# Altium footprint library IC_updated.PcbLib: 64 footprints (part 2 of 4)
Each footprint in its own frame and in the unit in brackets; x right, y up, seen from the top. Pads: shape width x height; smd on the part's side, far side on the other; paste and mask are expansions set on the pad; w line width, h text height; cw(c..) or ccw(c..) is an arc to the next point about the centre after c.
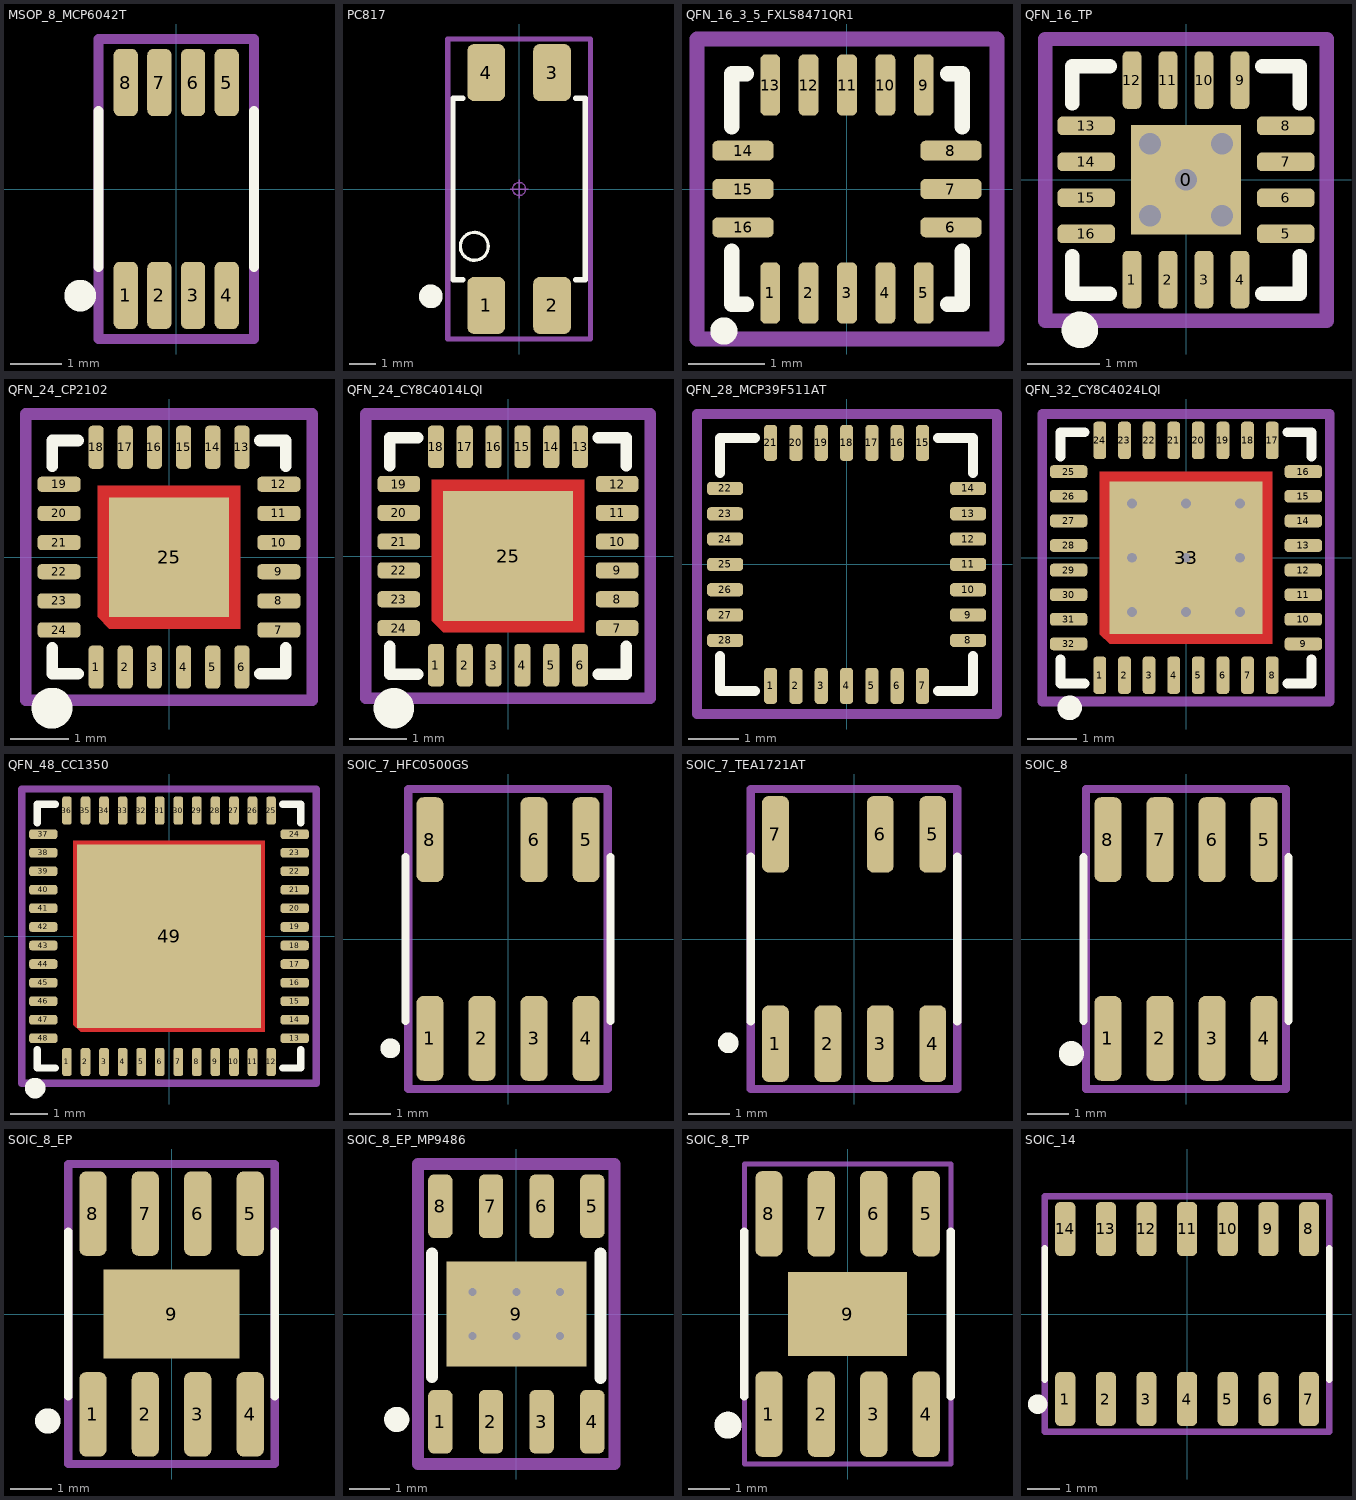
[diagram p1: the footprints below, top view; thin cyan lines are the x and y axes]

## MSOP_8_MCP6042T [mm] "Small Outline Pkg (SOP), 0.65 mm pitch; 8 pin, 3.00 mm L X 3.00 mm W X 1.10 mm H body"
height 1.1
pads (8):
  rrect51% 0.47x1.3 smd: 1(-0.975,-2.055) 2(-0.325,-2.055) 3(0.325,-2.055) 4(0.975,-2.055) 5(0.975,2.055) 6(0.325,2.055) 7(-0.325,2.055) 8(-0.975,2.055)
Top Overlay:
  circle w0.508: c-1.854,-2.057 r0.05
  lines w0.2: -1.5,-1.5 -1.5,1.5 ; 1.5,-1.5 1.5,1.5
Mechanical 13:
  lines w0.2: -1.5,-2.896 1.5,-2.896 1.5,2.896 -1.5,2.896 -1.5,-2.896
  text ".Designator" at -1.295,-0.406 h1.5
3D body "SOP8P65_300X490X110L60X31.STEP": height 1.1, standoff 0, extent -1.5,-2.45 1.5,2.45

## PC817 [mm] "Small Outline IC (SOIC), 2.54 mm pitch; 4 pin, 4.60 mm L X 6.00 mm W X 3.85 mm H body"
height 3.85
pads (4):
  rrect34% 1.45x2.19 smd: 1(-1.27,-4.49) 2(1.27,-4.49) 3(1.27,4.49) 4(-1.27,4.49)
Top Overlay:
  circle w0.508: c-3.404,-4.14 r0.203
  circle w0.127: c-1.727,-2.21 r0.539
  lines w0.2: -2.175,-3.5 -2.55,-3.5 -2.55,3.5 -2.175,3.5 ; 2.175,-3.5 2.55,-3.5 2.55,3.5 2.175,3.5
Mechanical 13:
  lines w0.2: -2.75,-5.785 2.75,-5.785 2.75,-3.7 2.75,3.7 2.75,5.785 -2.75,5.785 -2.75,3.7 -2.75,-3.7 -2.75,-5.785
  text ".Designator" at 0.279,-3.099 h1.5
Mechanical 15:
  circle w0.05: c0,0 r0.25
  lines w0.05: -0.35,0 0.35,0 ; 0,-0.35 0,0.35
3D body "User Library-PC817_Gullwing.STEP": height 3.75, standoff -0.1, extent -2.29,-5.025 2.29,4.975

## QFN_16_3_5_FXLS8471QR1 [mm] "Pullback Quad Flat No-Lead (PQFN), 0.50 mm pitch; square, 5 pin X 3 pin, 3.00 mm L X 3.00 mm W X 0.60 mm H body"
height 0.6
pads (16):
  rrect54% 0.26x0.8 smd: 1(-1,-1.355) 2(-0.5,-1.355) 3(0,-1.355) 4(0.5,-1.355) 5(1,-1.355) 9(1,1.355) 10(0.5,1.355) 11(0,1.355) 12(-0.5,1.355) 13(-1,1.355)
  rrect54% 0.8x0.26 smd: 6(1.355,-0.5) 7(1.355,0) 8(1.355,0.5) 14(-1.355,0.5) 15(-1.355,0) 16(-1.355,-0.5)
Top Overlay:
  circle w0.254: c-1.605,-1.851 r0.05
  lines w0.2: -1.5,-0.81 -1.5,-1.5 -1.31,-1.5 ; -1.5,0.81 -1.5,1.5 -1.31,1.5 ; 1.31,-1.5 1.5,-1.5 1.5,-0.81 ; 1.31,1.5 1.5,1.5 1.5,0.81
Mechanical 13:
  lines w0.2: -1.955,-1.955 -1.955,-0.83 -1.955,0.83 -1.955,1.955 -1.33,1.955 1.33,1.955 1.955,1.955 1.955,0.83 1.955,-0.83 1.955,-1.955 1.33,-1.955 -1.33,-1.955 -1.955,-1.955
  text ".Designator" at -0.737,-0.152 h1
3D body "QFN17P50_300X300X100L46X24T0.STEP": height 1, standoff 0, extent -1.55,-1.55 1.55,1.55

## QFN_16_TP [mm] "Quad Flat No-Lead (QFN), 0.50 mm pitch; square, 4 pin X 4 pin, 3.00 mm L X 3.00 mm W X 0.80 mm H body"
height 0.8
pads (17):
  rect 1.524x1.524 smd: 0(0,0)
  rrect54% 0.26x0.8 smd: 1(-0.75,-1.385) 2(-0.25,-1.385) 3(0.25,-1.385) 4(0.75,-1.385) 9(0.75,1.385) 10(0.25,1.385) 11(-0.25,1.385) 12(-0.75,1.385)
  rrect54% 0.8x0.26 smd: 5(1.385,-0.75) 6(1.385,-0.25) 7(1.385,0.25) 8(1.385,0.75) 13(-1.385,0.75) 14(-1.385,0.25) 15(-1.385,-0.25) 16(-1.385,-0.75)
via -0.5,0.5 diameter 0.5 hole 0.3
via -0.5,-0.5 diameter 0.5 hole 0.3
via 0.5,-0.5 diameter 0.5 hole 0.3
via 0.5,0.5 diameter 0.5 hole 0.3
via 0,0 diameter 0.5 hole 0.3
Top Overlay:
  circle w0.254: c-1.473,-2.083 r0.127
  lines w0.2: -1.58,-1.06 -1.58,-1.58 -1.06,-1.58 ; -1.58,1.06 -1.58,1.58 -1.06,1.58 ; 1.06,-1.58 1.58,-1.58 1.58,-1.06 ; 1.06,1.58 1.58,1.58 1.58,1.06
Mechanical 13:
  lines w0.2: -1.956,-1.956 -1.956,1.956 1.956,1.956 1.956,-1.956 -1.956,-1.956
  text ".Designator" at -1.727,-0.254 h1.5
3D body "QFN16P50_300X300X80L40X24.STEP": height 0.8, standoff 0, extent -1.55,-1.55 1.55,1.55

## QFN_24_CP2102 [mm] "Quad Flat No-Lead (QFN with Tab), 0.50 mm pitch; square, 6 pin X 6 pin, 4.00 mm L X 4.00 mm W X 0.80 mm H body"
height 0.8
pads (25):
  rrect54% 0.26x0.74 smd: 1(-1.25,-1.885) 2(-0.75,-1.885) 3(-0.25,-1.885) 4(0.25,-1.885) 5(0.75,-1.885) 6(1.25,-1.885) 13(1.25,1.885) 14(0.75,1.885) 15(0.25,1.885) 16(-0.25,1.885) 17(-0.75,1.885) 18(-1.25,1.885)
  rrect54% 0.74x0.26 smd: 7(1.885,-1.25) 8(1.885,-0.75) 9(1.885,-0.25) 10(1.885,0.25) 11(1.885,0.75) 12(1.885,1.25) 19(-1.885,1.25) 20(-1.885,0.75) 21(-1.885,0.25) 22(-1.885,-0.25) 23(-1.885,-0.75) 24(-1.885,-1.25)
  rect 2.05x2.05 smd paste-2.05 mask-2.05: 25(0,0)
Top Layer:
  region: 1.225,-1.225 -1.025,-1.225 -1.225,-1.025 -1.225,1.225 1.225,1.225
Top Overlay:
  circle w0.5: c-2.007,-2.591 r0.1
  lines w0.2: -2,-1.56 -2,-2 -1.56,-2 ; -2,1.56 -2,2 -1.56,2 ; 1.56,-2 2,-2 2,-1.56 ; 1.56,2 2,2 2,1.56
Top Paste:
  region: -0.18,0.18 -1.05,0.18 -1.05,1.05 -0.18,1.05
  region: -0.18,-1.05 -1.05,-1.05 -1.05,-0.18 -0.18,-0.18
  region: 1.05,0.18 0.18,0.18 0.18,1.05 1.05,1.05
  region: 1.05,-1.05 0.18,-1.05 0.18,-0.18 1.05,-0.18
Top Solder:
  region: 1.225,-1.225 -1.025,-1.225 -1.225,-1.025 -1.225,1.225 1.225,1.225
Mechanical 13:
  lines w0.2: -2.455,-2.455 -1.58,-2.455 1.58,-2.455 2.455,-2.455 2.455,-1.58 2.455,1.58 2.455,2.455 1.58,2.455 -1.58,2.455 -2.455,2.455 -2.455,1.58 -2.455,-1.58 -2.455,-2.455
  text ".Designator" at -1.905,-0.127 h1
3D body "QFN25P50_400X400X80L40X24T245.STEP": height 0.8, standoff 0, extent -2.05,-2.05 2.05,2.05

## QFN_24_CY8C4014LQI [mm] "Quad Flat No-Lead (QFN with Tab), 0.50 mm pitch; square, 6 pin X 6 pin, 4.00 mm L X 4.00 mm W X 0.55 mm H body"
height 0.55
pads (25):
  rrect50% 0.28x0.74 smd: 1(-1.25,-1.895) 2(-0.75,-1.895) 3(-0.25,-1.895) 4(0.25,-1.895) 5(0.75,-1.895) 6(1.25,-1.895) 13(1.25,1.895) 14(0.75,1.895) 15(0.25,1.895) 16(-0.25,1.895) 17(-0.75,1.895) 18(-1.25,1.895)
  rrect50% 0.74x0.28 smd: 7(1.895,-1.25) 8(1.895,-0.75) 9(1.895,-0.25) 10(1.895,0.25) 11(1.895,0.75) 12(1.895,1.25) 19(-1.895,1.25) 20(-1.895,0.75) 21(-1.895,0.25) 22(-1.895,-0.25) 23(-1.895,-0.75) 24(-1.895,-1.25)
  rect 2.25x2.25 smd paste-2.25 mask-2.25: 25(0,0)
Top Layer:
  region: 1.325,-1.325 -1.125,-1.325 -1.325,-1.125 -1.325,1.325 1.325,1.325
Top Overlay:
  circle w0.5: c-1.981,-2.642 r0.1
  lines w0.2: -2.05,-1.57 -2.05,-2.05 -1.57,-2.05 ; -2.05,1.57 -2.05,2.05 -1.57,2.05 ; 1.57,-2.05 2.05,-2.05 2.05,-1.57 ; 1.57,2.05 2.05,2.05 2.05,1.57
Top Paste:
  region: 1.135,-1.135 0.195,-1.135 0.195,-0.195 1.135,-0.195
  region: 1.135,0.195 0.195,0.195 0.195,1.135 1.135,1.135
  region: -0.195,-1.135 -1.135,-1.135 -1.135,-0.195 -0.195,-0.195
  region: -0.195,0.195 -1.135,0.195 -1.135,1.135 -0.195,1.135
Top Solder:
  region: 1.325,-1.325 -1.125,-1.325 -1.325,-1.125 -1.325,1.325 1.325,1.325
Mechanical 13:
  lines w0.2: -2.465,-2.465 -2.465,-1.59 -2.465,1.59 -2.465,2.465 -1.59,2.465 1.59,2.465 2.465,2.465 2.465,1.59 2.465,-1.59 2.465,-2.465 1.59,-2.465 -1.59,-2.465 -2.465,-2.465
  text ".Designator" at -1.93,-0.152 h1
3D body "QFN25P50_400X400X55L40X25T265.STEP": height 0.55, standoff 0, extent -2.05,-2.05 2.05,2.05

## QFN_28_MCP39F511AT [mm] "Quad Flat No-Lead (QFN), 0.50 mm pitch; square, 7 pin X 7 pin, 5.00 mm L X 5.00 mm W X 1.00 mm H body"
height 1
pads (28):
  rrect54% 0.26x0.71 smd: 1(-1.5,-2.4) 2(-1,-2.4) 3(-0.5,-2.4) 4(0,-2.4) 5(0.5,-2.4) 6(1,-2.4) 7(1.5,-2.4) 15(1.5,2.4) 16(1,2.4) 17(0.5,2.4) 18(0,2.4) 19(-0.5,2.4) 20(-1,2.4) 21(-1.5,2.4)
  rrect54% 0.71x0.26 smd: 8(2.4,-1.5) 9(2.4,-1) 10(2.4,-0.5) 11(2.4,0) 12(2.4,0.5) 13(2.4,1) 14(2.4,1.5) 22(-2.4,1.5) 23(-2.4,1) 24(-2.4,0.5) 25(-2.4,0) 26(-2.4,-0.5) 27(-2.4,-1) 28(-2.4,-1.5)
Top Overlay:
  lines w0.2: -2.5,-1.81 -2.5,-2.5 -1.81,-2.5 ; -2.5,1.81 -2.5,2.5 -1.81,2.5 ; 1.81,-2.5 2.5,-2.5 2.5,-1.81 ; 1.81,2.5 2.5,2.5 2.5,1.81
Mechanical 13:
  lines w0.2: -2.955,-2.955 -2.955,2.972 2.972,2.972 2.972,-2.955 -2.955,-2.955
  text ".Designator" at -1.854,-0.381 h1.5
3D body "QFN28P50_500X500X100L40X24.STEP": height 1, standoff 0, extent -2.55,-2.55 2.55,2.55

## QFN_32_CY8C4024LQI [mm]
pads (33):
  rrect54% 0.26x0.76 smd: 1(-1.75,-2.385) 2(-1.25,-2.385) 3(-0.75,-2.385) 4(-0.25,-2.385) 5(0.25,-2.385) 6(0.75,-2.385) 7(1.25,-2.385) 8(1.75,-2.385) 17(1.75,2.385) 18(1.25,2.385) 19(0.75,2.385) 20(0.25,2.385) 21(-0.25,2.385) 22(-0.75,2.385) 23(-1.25,2.385) 24(-1.75,2.385)
  rrect54% 0.76x0.26 smd: 9(2.385,-1.75) 10(2.385,-1.25) 11(2.385,-0.75) 12(2.385,-0.25) 13(2.385,0.25) 14(2.385,0.75) 15(2.385,1.25) 16(2.385,1.75) 25(-2.385,1.75) 26(-2.385,1.25) 27(-2.385,0.75) 28(-2.385,0.25) 29(-2.385,-0.25) 30(-2.385,-0.75) 31(-2.385,-1.25) 32(-2.385,-1.75)
  rect 3.1x3.1 smd paste-3.1 mask-3.1: 33(0,0)
via 1.1,-1.1 diameter 0.5 hole 0.2
via 0,-1.1 diameter 0.5 hole 0.2
via -1.1,-1.1 diameter 0.5 hole 0.2
via 1.1,0 diameter 0.5 hole 0.2
via 0,0 diameter 0.5 hole 0.2
via -1.1,0 diameter 0.5 hole 0.2
via 1.1,1.1 diameter 0.5 hole 0.2
via 0,1.1 diameter 0.5 hole 0.2
via -1.1,1.1 diameter 0.5 hole 0.2
Top Layer:
  region: 1.75,-1.75 -1.55,-1.75 -1.75,-1.55 -1.75,1.75 1.75,1.75
Top Overlay:
  circle w0.25: c-2.362,-3.048 r0.125
  lines w0.2: -2.55,-2.06 -2.55,-2.55 -2.06,-2.55 ; -2.55,2.06 -2.55,2.55 -2.06,2.55 ; 2.06,-2.55 2.55,-2.55 2.55,-2.06 ; 2.06,2.55 2.55,2.55 2.55,2.06
Top Paste:
  region: -0.255,0.255 -1.495,0.255 -1.495,1.495 -0.255,1.495
  region: -0.255,-1.495 -1.495,-1.495 -1.495,-0.255 -0.255,-0.255
  region: 1.495,0.255 0.255,0.255 0.255,1.495 1.495,1.495
  region: 1.495,-1.495 0.255,-1.495 0.255,-0.255 1.495,-0.255
Top Solder:
  region: 1.75,-1.75 -1.55,-1.75 -1.75,-1.55 -1.75,1.75 1.75,1.75
Mechanical 13:
  lines w0.2: -2.921,-2.921 2.921,-2.921 2.921,2.921 -2.921,2.921 -2.921,-2.921
  text ".Designator" at -1.956,-0.076 h1.5
3D body "QFN33P50_500X500X60L40X24T350.STEP": height 0.6, standoff 0, extent -2.55,-2.55 2.55,2.55

## QFN_48_CC1350 [mm] "Quad Flat No-Lead (QFN with Tab), 0.50 mm pitch; square, 12 pin X 12 pin, 7.00 mm L X 7.00 mm W X 1.00 mm H body"
height 1
pads (49):
  rrect54% 0.26x0.76 smd: 1(-2.75,-3.385) 2(-2.25,-3.385) 3(-1.75,-3.385) 4(-1.25,-3.385) 5(-0.75,-3.385) 6(-0.25,-3.385) 7(0.25,-3.385) 8(0.75,-3.385) 9(1.25,-3.385) 10(1.75,-3.385) 11(2.25,-3.385) 12(2.75,-3.385) 25(2.75,3.385) 26(2.25,3.385) 27(1.75,3.385) 28(1.25,3.385) 29(0.75,3.385) 30(0.25,3.385) 31(-0.25,3.385) 32(-0.75,3.385) 33(-1.25,3.385) 34(-1.75,3.385) 35(-2.25,3.385) 36(-2.75,3.385)
  rrect54% 0.76x0.26 smd: 13(3.385,-2.75) 14(3.385,-2.25) 15(3.385,-1.75) 16(3.385,-1.25) 17(3.385,-0.75) 18(3.385,-0.25) 19(3.385,0.25) 20(3.385,0.75) 21(3.385,1.25) 22(3.385,1.75) 23(3.385,2.25) 24(3.385,2.75) 37(-3.385,2.75) 38(-3.385,2.25) 39(-3.385,1.75) 40(-3.385,1.25) 41(-3.385,0.75) 42(-3.385,0.25) 43(-3.385,-0.25) 44(-3.385,-0.75) 45(-3.385,-1.25) 46(-3.385,-1.75) 47(-3.385,-2.25) 48(-3.385,-2.75)
  rect 4.95x4.95 smd paste-4.95 mask-4.95: 49(0,0)
Top Layer:
  region: 2.575,-2.575 -2.378,-2.575 -2.575,-2.378 -2.575,2.575 2.575,2.575
Top Overlay:
  circle w0.5: c-3.607,-4.089 r0.025
  lines w0.2: -3.55,-3.06 -3.55,-3.55 -3.06,-3.55 ; -3.55,3.06 -3.55,3.55 -3.06,3.55 ; 3.06,-3.55 3.55,-3.55 3.55,-3.06 ; 3.06,3.55 3.55,3.55 3.55,3.06
Top Paste:
  region: 2.195,-2.195 0.375,-2.195 0.375,-0.375 2.195,-0.375
  region: 2.195,0.375 0.375,0.375 0.375,2.195 2.195,2.195
  region: -0.375,-2.195 -2.195,-2.195 -2.195,-0.375 -0.375,-0.375
  region: -0.375,0.375 -2.195,0.375 -2.195,2.195 -0.375,2.195
Top Solder:
  region: 2.575,-2.575 -2.378,-2.575 -2.575,-2.378 -2.575,2.575 2.575,2.575
Mechanical 13:
  lines w0.2: -3.965,-3.965 -3.965,-3.08 -3.965,3.08 -3.965,3.965 -3.08,3.965 3.08,3.965 3.965,3.965 3.965,3.08 3.965,-3.08 3.965,-3.965 3.08,-3.965 -3.08,-3.965 -3.965,-3.965
  text ".Designator" at -2.946,-0.152 h1.5
3D body "QFN49P50_700X700X100L40X24T515.STEP": height 1, standoff 0, extent -3.55,-3.55 3.55,3.55

## SOIC_7_HFC0500GS [mm] "Small Outline IC (SOIC), 1.27 mm pitch; 8 pin, 4.90 mm L X 3.90 mm W X 1.75 mm H body"
height 1.75
pads (7):
  rrect52% 0.66x2.07 smd: 1(-1.905,-2.425) 2(-0.635,-2.425) 3(0.635,-2.425) 4(1.905,-2.425) 5(1.905,2.425) 6(0.635,2.425) 8(-1.905,2.425)
Top Overlay:
  circle w0.381: c-2.87,-2.667 r0.05
  lines w0.2: -2.5,-2 -2.5,2 ; 2.5,-2 2.5,2
Mechanical 13:
  lines w0.2: -2.435,-3.66 -2.435,-2.2 -2.435,2.2 -2.435,3.66 2.435,3.66 2.435,2.2 2.435,-2.2 2.435,-3.66 -2.435,-3.66
  text ".Designator" at -2.184,-0.254 h1.5
3D body "SOIC8P127_490X600X175L84X42.STEP": height 1.75, standoff 0, extent -2.45,-3 2.45,3

## SOIC_7_TEA1721AT [mm] "Small Outline IC (SOIC), 1.27 mm pitch; 8 pin, 4.90 mm L X 3.90 mm W X 1.75 mm H body"
height 1.75
pads (7):
  rrect49% 0.65x1.85 smd: 1(-1.905,-2.535) 2(-0.635,-2.535) 3(0.635,-2.535) 4(1.905,-2.535) 5(1.905,2.535) 6(0.635,2.535) 7(-1.905,2.535)
Top Overlay:
  circle w0.25: c-3.048,-2.515 r0.125
  lines w0.2: -2.5,-2 -2.5,2 ; 2.5,-2 2.5,2
Mechanical 13:
  lines w0.2: -2.5,-3.632 -2.5,3.632 2.5,3.632 2.5,-3.632 -2.5,-3.632
  text ".Designator" at -2.261,-0.406 h1.5
3D body "SOIC8P127_490X600X175L70X42.STEP": height 1.75, standoff 0, extent -2.45,-3 2.45,3

## SOIC_8 [mm] "Small Outline IC (SOIC), 1.27 mm pitch; 8 pin, 4.905 mm L X 3.895 mm W X 1.75 mm H body"
height 1.75
pads (8):
  rrect52% 0.66x2.07 smd: 1(-1.905,-2.42) 2(-0.635,-2.42) 3(0.635,-2.42) 4(1.905,-2.42) 5(1.905,2.42) 6(0.635,2.42) 7(-0.635,2.42) 8(-1.905,2.42)
Top Overlay:
  circle w0.508: c-2.794,-2.794 r0.05
  lines w0.2: -2.5,-1.99 -2.5,1.99 ; 2.5,-1.99 2.5,1.99
Mechanical 13:
  lines w0.2: -2.435,-3.655 -2.435,-2.19 -2.435,2.19 -2.435,3.655 2.435,3.655 2.435,2.19 2.435,-2.19 2.435,-3.655 -2.435,-3.655
  text ".Designator" at -2.184,-0.305 h1.5
3D body "SOIC8P127_490X599X175L84X41.STEP": height 1.75, standoff 0, extent -2.452,-2.997 2.452,2.997

## SOIC_8_EP [mm] "Small Outline IC (SOIC with Tab), 1.27 mm pitch; 8 pin, 4.90 mm L X 3.90 mm W X 1.70 mm H body"
height 1.7
pads (9):
  rrect52% 0.66x2.05 smd: 1(-1.905,-2.43) 2(-0.635,-2.43) 3(0.635,-2.43) 4(1.905,-2.43) 5(1.905,2.43) 6(0.635,2.43) 7(-0.635,2.43) 8(-1.905,2.43)
  rect 3.3x2.159 smd paste-3.3: 9(0,0)
Top Overlay:
  circle w0.5: c-2.997,-2.591 r0.057
  lines w0.2: -2.5,-2 -2.5,2 ; 2.5,-2 2.5,2
Top Paste:
  region: -0.175,0.175 -1.475,0.175 -1.475,1.025 -0.175,1.025
  region: -0.175,-1.025 -1.475,-1.025 -1.475,-0.175 -0.175,-0.175
  region: 1.475,0.175 0.175,0.175 0.175,1.025 1.475,1.025
  region: 1.475,-1.025 0.175,-1.025 0.175,-0.175 1.475,-0.175
Mechanical 13:
  lines w0.2: -2.5,-3.632 2.5,-3.632 2.5,3.632 -2.5,3.632 -2.5,-3.632
  text ".Designator" at -2.134,-0.508 h1.5
3D body "SOIC9P127_490X600X170L84X42T330X241.STEP": height 1.7, standoff 0, extent -2.45,-3 2.45,3

## SOIC_8_EP_MP9486 [mm]
pads (9):
  rrect50% 0.61x1.6 smd: 1(-1.905,-2.7) 2(-0.635,-2.7) 3(0.635,-2.7) 4(1.905,-2.7) 5(1.905,2.7) 6(0.635,2.7) 7(-0.635,2.7) 8(-1.905,2.7)
  rect 3.51x2.62 smd: 9(0,0)
via 1.1,0.55 diameter 0.5 hole 0.2
via 1.1,-0.55 diameter 0.5 hole 0.2
via 0,0.55 diameter 0.5 hole 0.2
via 0,-0.55 diameter 0.5 hole 0.2
via -1.1,0.55 diameter 0.5 hole 0.2
via -1.1,-0.55 diameter 0.5 hole 0.2
Top Overlay:
  circle w0.381: c-2.997,-2.642 r0.125
  lines w0.3: -2.108,-1.575 -2.108,1.515 ; 2.108,-1.6 2.108,1.52
Mechanical 13:
  lines w0.3: -2.464,-3.759 -2.464,3.759 2.464,3.759 2.464,-3.759 -2.464,-3.759
  text ".Designator" at -2.311,-0.432 h1.5
3D body "SOIC8P127_490X599X175L84X41.STEP": height 1.75, standoff 0, extent -2.478,-2.997 2.427,2.997

## SOIC_8_TP [mm] "Small Outline IC (SOIC with Tab), 1.27 mm pitch; 8 pin, 4.90 mm L X 3.90 mm W X 1.70 mm H body"
height 1.7
pads (9):
  rrect52% 0.66x2.07 smd: 1(-1.905,-2.425) 2(-0.635,-2.425) 3(0.635,-2.425) 4(1.905,-2.425) 5(1.905,2.425) 6(0.635,2.425) 7(-0.635,2.425) 8(-1.905,2.425)
  rect 2.875x2.025 smd paste-2.875: 9(0,0)
Top Overlay:
  lines w0.2: -2.5,-2 -2.5,2 ; 2.5,-2 2.5,2
  lines w0.508: -2.825,-2.678 ccw(c-2.896,-2.692) -2.824,-2.692
Top Paste:
  region: -0.15,0.15 -1.29,0.15 -1.29,0.87 -0.15,0.87
  region: -0.15,-0.87 -1.29,-0.87 -1.29,-0.15 -0.15,-0.15
  region: 1.29,0.15 0.15,0.15 0.15,0.87 1.29,0.87
  region: 1.29,-0.87 0.15,-0.87 0.15,-0.15 1.29,-0.15
Mechanical 13:
  lines w0.12: -2.5,-3.632 2.5,-3.632 2.5,3.632 -2.5,3.632 -2.5,-3.632
  text ".Designator" at -2.159,-0.457 h1.5
3D body "SOIC9P127_490X600X170L83X41T287X202.STEP": height 1.7, standoff 0, extent -2.45,-3 2.45,3

## SOIC_14 [mm] "Small Outline IC (SOIC), 1.27 mm pitch; 14 pin, 8.90 mm L X 3.90 mm W X 1.75 mm H body"
height 1.75
pads (14):
  rrect51% 0.63x1.69 smd: 1(-3.81,-2.66) 2(-2.54,-2.66) 3(-1.27,-2.66) 4(0,-2.66) 5(1.27,-2.66) 6(2.54,-2.66) 7(3.81,-2.66) 8(3.81,2.66) 9(2.54,2.66) 10(1.27,2.66) 11(0,2.66) 12(-1.27,2.66) 13(-2.54,2.66) 14(-3.81,2.66)
Top Overlay:
  circle w0.508: c-4.674,-2.819 r0.05
  lines w0.2: -4.45,-2.05 -4.45,2.05 ; 4.45,-2.05 4.45,2.05
Mechanical 13:
  lines w0.2: -4.45,-3.683 4.45,-3.683 4.45,3.683 -4.45,3.683 -4.45,-3.683
  text ".Designator" at -3.912,-0.254 h1.5
3D body "SOIC14P127_890X600X175L55X41.STEP": height 1.75, standoff 0, extent -4.45,-3 4.45,3